# Altium footprint library VEGG_PcbLib_ALT.PcbLib: 140 footprints (part 2 of 9)
Each footprint in its own frame and in the unit in brackets; x right, y up, seen from the top. Pads: shape width x height; smd on the part's side, far side on the other; paste and mask are expansions set on the pad; w line width, h text height; cw(c..) or ccw(c..) is an arc to the next point about the centre after c.
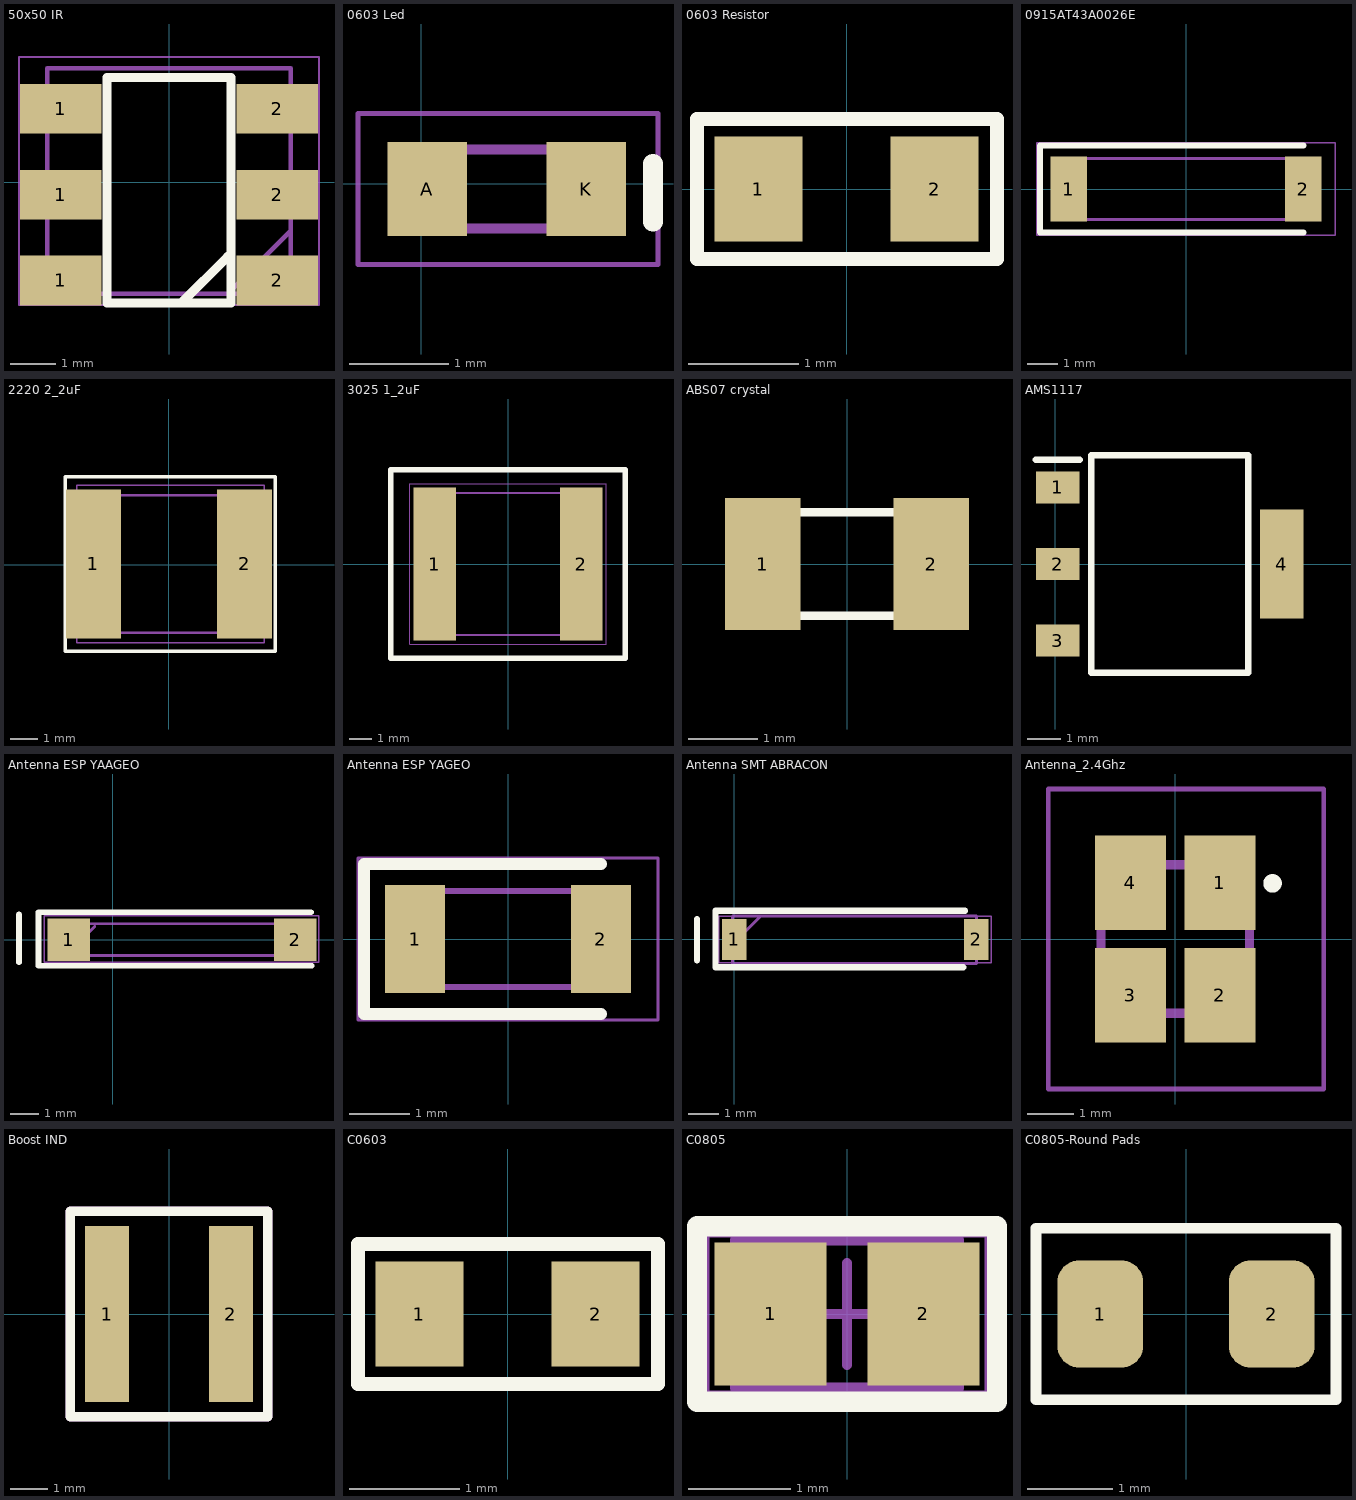
[diagram p1: the footprints below, top view; thin cyan lines are the x and y axes]

## 50x50 IR [mm]
pads (6):
  rect 1.8x1.1 smd: 1(-2.4,-2.179) 1(-2.4,-0.277) 1(-2.4,1.625) 2(2.4,-2.179) 2(2.4,-0.277) 2(2.4,1.625)
Top Overlay:
  lines w0.025: 0.076,-2.678 0.272,-2.678
  lines w0.2: -1.375,-2.678 1.375,-2.678 1.375,2.322 -1.375,2.322 -1.375,-2.678
  lines w0.203: 0.272,-2.678 1.299,-1.651
Mechanical 15:
  lines w0.1: 1.325,-2.45 2.675,-1.1 ; -2.7,-2.475 2.7,-2.475 2.7,2.525 -2.7,2.525 -2.7,-2.475
Mechanical 20:
  lines w0.05: -3.325,-2.725 3.325,-2.725 3.325,2.775 -3.325,2.775 -3.325,-2.725
3D body "User Library-smd_led_5050.X_T": height 1.6, standoff 0, extent -2.756,-2.753 2.544,2.247

## 0603 Led [mm]
pads (2):
  rect 0.8x0.95 smd: A(0.064,-0.051) K(1.664,-0.051)
Top Overlay:
  lines w0.2: 2.337,-0.381 2.337,0.203
Mechanical 15:
  lines w0.1: 0.064,0.082 0.331,0.349 ; 0.064,-0.451 1.664,-0.451 1.664,0.349 0.064,0.349 0.064,-0.451
Mechanical 20:
  lines w0.05: -0.635,-0.813 2.388,-0.813 2.388,0.711 -0.635,0.711 -0.635,-0.813
3D body "User Library-LED SMD0603.STEP": height 0.63, standoff -0.05, extent 0.064,-0.446 1.714,0.279

## 0603 Resistor [mm]
pads (2):
  rect 0.8x0.95 smd: 1(-0.8,0) 2(0.8,0)
Top Overlay:
  lines w0.125: -1.359,-0.635 1.367,-0.635 1.367,0.635 -1.359,0.635 -1.359,-0.635
3D body "SMD R-0603.STEP": height 0.45, standoff -0.01, extent -0.8,-0.4 0.8,0.4

## 0915AT43A0026E [mm] "m-bus project"
pads (2):
  rect 1.2x2.15 smd: 1(-3.85,0) 2(3.85,0)
Top Overlay:
  lines w0.2: 3.85,-1.425 -4.8,-1.425 -4.8,1.425 3.85,1.425
Mechanical 13:
  lines w0.1: -4,0.4 -3.4,1 ; -4,-1 -4,1 4,1 4,-1 -4,-1
Mechanical 15:
  lines w0.05: -4.9,-1.525 -4.9,1.525 4.9,1.525 4.9,-1.525 -4.9,-1.525
3D body "0915AT43A0026E.stp": height 0.9, standoff 0, extent -4,-1 4,1

## 2220 2_2uF [mm]
pads (2):
  rect 2x5.41 smd: 1(-2.743,0.025) 2(2.743,0.025)
Top Overlay:
  lines w0.127: -3.759,-3.15 3.861,-3.15 3.861,3.2 -3.759,3.2 -3.759,-3.15
Mechanical 15:
  lines w0.1: -2.799,-2.475 2.901,-2.475 2.901,2.525 -2.799,2.525 -2.799,-2.475
Mechanical 20:
  lines w0.05: -3.354,-2.835 3.456,-2.835 3.456,2.885 -3.354,2.885 -3.354,-2.835
3D body "C5750X6S2W225K250KA.stp": height 2.77, standoff 0.03, extent -2.65,-2.45 2.65,2.45

## 3025 1_2uF [mm]
pads (2):
  rect 1.89x6.81 smd: 1(-3.26,0) 2(3.26,0)
Top Overlay:
  lines w0.254: -5.207,-4.191 5.207,-4.191 5.207,4.191 -5.207,4.191 -5.207,-4.191
Mechanical 15:
  lines w0.1: -3.75,-3.15 3.75,-3.15 3.75,3.15 -3.75,3.15 -3.75,-3.15
Mechanical 20:
  lines w0.05: -4.355,-3.56 4.355,-3.56 4.355,3.56 -4.355,3.56 -4.355,-3.56
3D body "KTS501B125M76N0T00.stp": height 3.5, standoff 0, extent -3.75,-3.15 3.75,3.15

## ABS07 crystal [mil]
pads (2):
  rect 43x75 smd: 1(-48,0) 2(48,0)
Top Overlay:
  lines w5: -63,-29.5 63,-29.5 63,29.5 -63,29.5 -63,-29.5
3D body "User Library-ABS07.X_T": height 35.83, standoff 0, extent -63.38,-29.91 63.39,29.93

## AMS1117 [mm] "SOT223"
pads (4):
  rect 1.3x0.95 smd: 1(0.079,2.29) 2(0.079,0) 3(0.079,-2.29)
  rect 1.3x3.25 smd: 4(6.779,0)
Top Overlay:
  lines w0.2: -0.571,3.115 0.729,3.115 ; 1.079,-3.252 1.079,3.252 5.779,3.252 5.779,-3.252 1.079,-3.252
3D body "AMS1117.SLDPRT": height 1.81, standoff -0.05, extent -0.213,-3.252 6.787,3.253

## Antenna ESP YAAGEO [mm] "ANT8010LL04R2400A"
pads (2):
  rect 1.5x1.5 smd: 1(-1.55,0) 2(6.401,0)
Top Overlay:
  lines w0.2: -3.302,-0.787 -3.302,0.889 ; 6.96,0.965 -2.616,0.965 -2.616,-0.914 6.985,-0.914
Mechanical 15:
  lines w0.1: -1.143,-0.03 -0.643,0.47 ; -1.6,-0.559 -1.6,0.559 6.401,0.559 6.401,-0.559 -1.6,-0.559
Mechanical 20:
  lines w0.05: -2.413,-0.787 -2.413,0.838 7.239,0.838 7.239,-0.787 -2.413,-0.787
3D body: height 1, standoff 0, extent -1.575,-0.787 6.426,0.813

## Antenna ESP YAGEO [mm] "ANT3216LL00R2400A"
pads (2):
  rect 1x1.8 smd: 1(-1.55,0) 2(1.55,0)
Top Overlay:
  lines w0.2: 1.55,-1.25 -2.4,-1.25 -2.4,1.25 1.55,1.25
Mechanical 15:
  lines w0.1: -1.6,0.3 -1.1,0.8 ; -1.6,-0.8 -1.6,0.8 1.6,0.8 1.6,-0.8 -1.6,-0.8
Mechanical 20:
  lines w0.05: -2.5,-1.35 -2.5,1.35 2.5,1.35 2.5,-1.35 -2.5,-1.35
3D body "ANT3216LL00R2400A.stp": height 1.35, standoff 0, extent -1.6,-0.8 1.6,0.8

## Antenna SMT ABRACON [mm] "ACAG0801-2450-T"
pads (2):
  rect 0.8x1.35 smd: 1(-0.001,0) 2(7.95,0)
Top Overlay:
  lines w0.2: -1.219,-0.686 -1.219,0.66 ; 7.518,-0.914 -0.61,-0.914 -0.61,0.94 7.569,0.94
Mechanical 15:
  lines w0.1: 0.338,0.237 0.838,0.737 ; -0.051,-0.787 -0.051,0.762 7.95,0.762 7.95,-0.787 -0.051,-0.787
Mechanical 20:
  lines w0.05: -0.508,-0.762 -0.508,0.762 8.433,0.762 8.433,-0.762 -0.508,-0.762
3D body: height 1, standoff 0, extent -0.051,-0.762 7.976,0.737

## Antenna_2.4Ghz [mm]
pads (4):
  rect 1.54x2.04 smd: 1(0.965,1.215) 2(0.965,-1.215) 3(-0.965,-1.215) 4(-0.965,1.215)
Top Overlay:
  lines w0.2: 2.1,1.1 cw(c2.1,1.2) 2.1,1.3 cw(c2.1,1.2) 2.1,1.1
Mechanical 15:
  lines w0.2: -1.6,-1.6 -1.6,1.6 1.6,1.6 1.6,-1.6 -1.6,-1.6
Mechanical 20:
  lines w0.1: -2.735,-3.235 -2.735,3.235 3.2,3.235 3.2,-3.235 -2.735,-3.235
3D body "479480001.stp": height 3.95, standoff -0.05, extent -1.57,-1.697 1.57,1.443

## Boost IND [mm]
pads (2):
  rect 1.18x4.7 smd: 1(-1.655,0) 2(1.655,0)
Top Overlay:
  lines w0.254: -2.64,-2.74 -2.64,2.74 2.64,2.74 2.64,-2.74 -2.64,-2.74
Mechanical 13:
  lines w0.254: -2.64,-2.74 2.64,-2.74 2.64,2.74 -2.64,2.74 -2.64,-2.74

## C0603 [mm]
pads (2):
  rect 0.8x0.95 smd: 1(-0.8,0) 2(0.8,0)
Top Overlay:
  lines w0.125: -1.359,-0.635 -1.359,0.635 1.367,0.635 1.367,-0.635 -1.359,-0.635
3D body "0603 SMD Capacitor.x_t": height 0.23, standoff -0.07, extent -0.8,-0.4 0.8,0.4

## C0805 [mm] "pol cap"
pads (2):
  rect 1.1x1.4 smd: 1(-0.75,0) 2(0.75,0)
Top Overlay:
  lines w0.2: -1.473,-0.864 -1.473,0.864 1.473,0.864 1.473,-0.864 -1.473,-0.864
Mechanical 13:
  lines w0.1: -1.1,-0.725 -1.1,0.725 1.1,0.725 1.1,-0.725 -1.1,-0.725
Mechanical 15:
  lines w0.1: -0.5,0 0.5,0 ; 0,-0.5 0,0.5 ; -1.4,-0.8 -1.4,0.8 1.4,0.8 1.4,-0.8 -1.4,-0.8
3D body "CAPC0805.STEP": height 0.82, standoff -0.08, extent -1.3,-0.678 1.301,0.678
3D body: height 0.25, standoff 0, extent -0.432,1.6 -0.432,1.6

## C0805-Round Pads [mm]
pads (2):
  rrect50% 1x1.25 smd: 1(-1,0) 2(1,0)
Top Overlay:
  lines w0.125: -1.75,-1 1.75,-1 1.75,1 -1.75,1 -1.75,-1
3D body "CAPC0805.STEP": height 0.82, standoff -0.08, extent -1.301,-0.678 1.301,0.678